# Altium footprint library UWRT_Footprint_Library_2020.PcbLib: 376 footprints (part 15 of 24)
Each footprint in its own frame and in the unit in brackets; x right, y up, seen from the top. Pads: shape width x height; smd on the part's side, far side on the other; paste and mask are expansions set on the pad; w line width, h text height; cw(c..) or ccw(c..) is an arc to the next point about the centre after c.
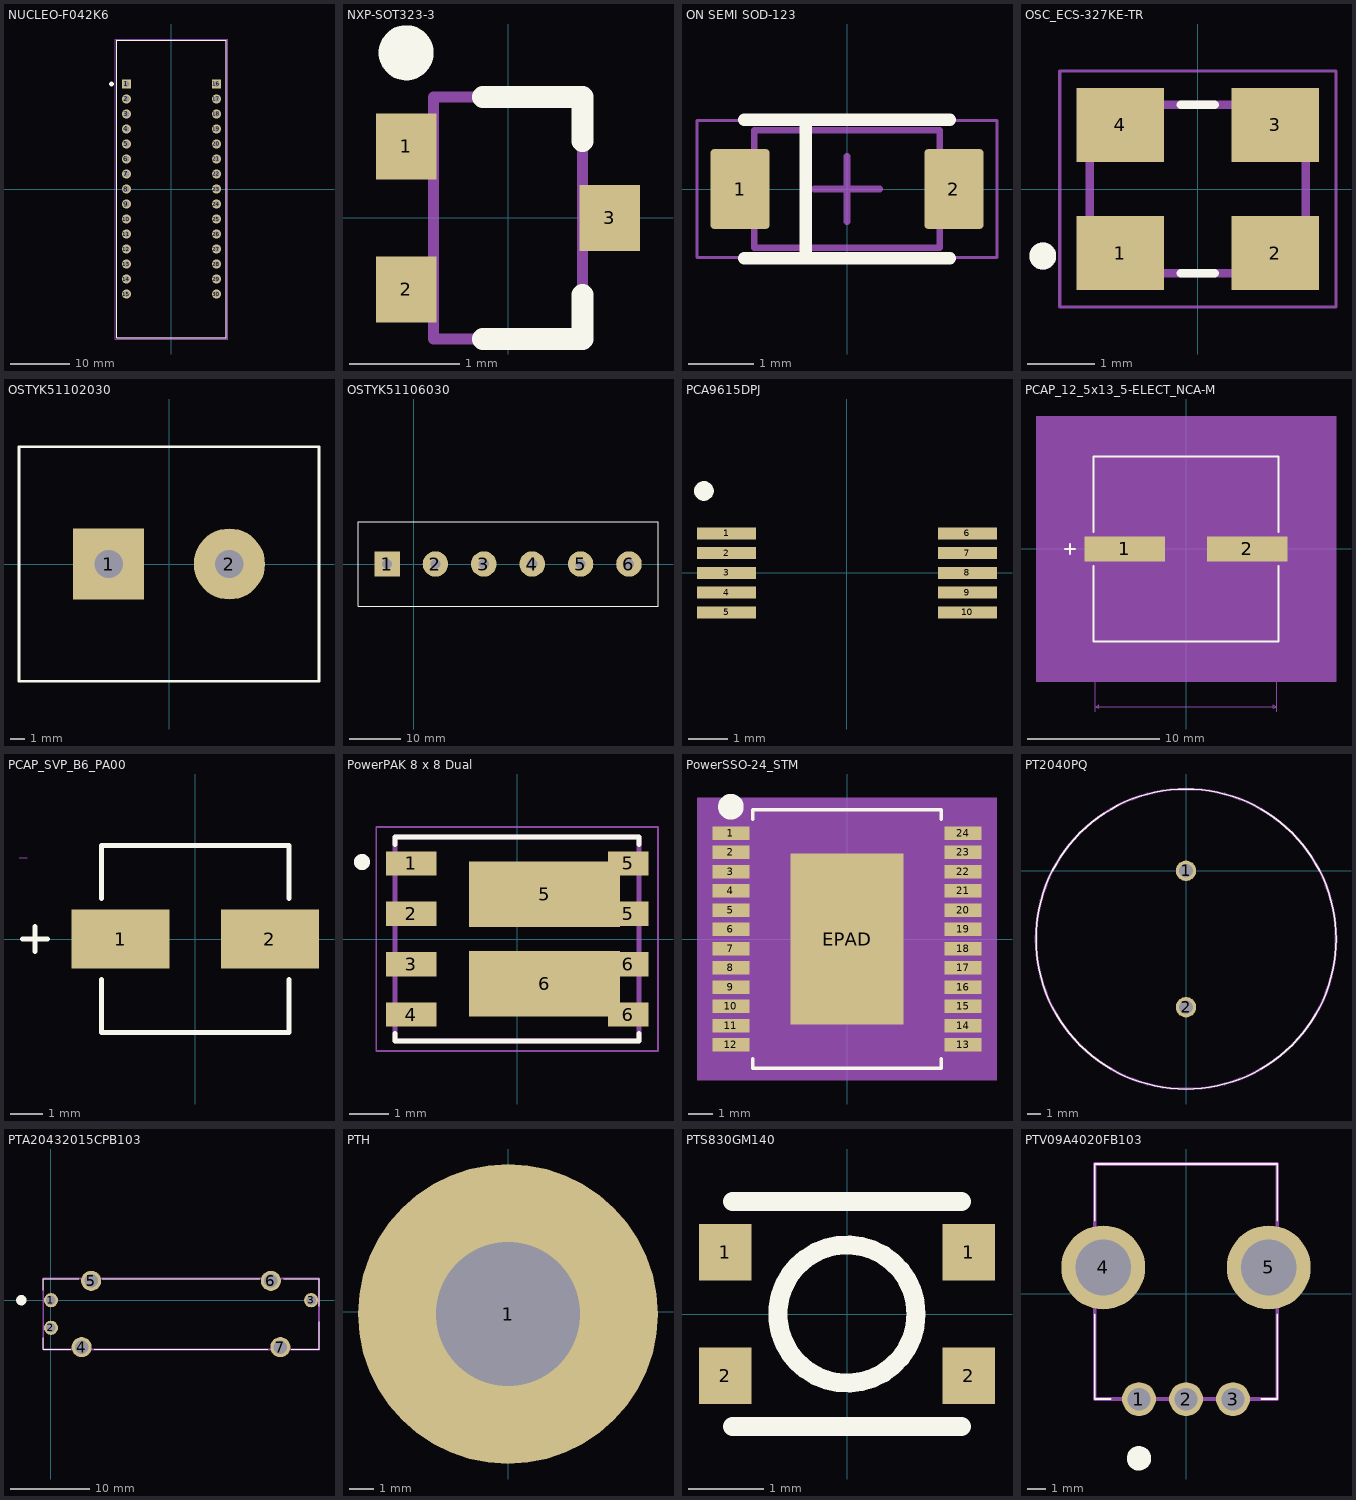
[diagram p14: the footprints below, top view; thin cyan lines are the x and y axes]

## NUCLEO-F042K6 [mm]
pads (30):
  rect 1.53x1.53 hole 1.02: 1(-7.62,17.78) 16(7.62,17.78)
  round 1.53 hole 1.02: 2(-7.62,15.24) 3(-7.62,12.7) 4(-7.62,10.16) 5(-7.62,7.62) 6(-7.62,5.08) 7(-7.62,2.54) 8(-7.62,0) 9(-7.62,-2.54) 10(-7.62,-5.08) 11(-7.62,-7.62) 12(-7.62,-10.16) 13(-7.62,-12.7) 14(-7.62,-15.24) 15(-7.62,-17.78) 17(7.62,15.24) 18(7.62,12.7) 19(7.62,10.16) 20(7.62,7.62) 21(7.62,5.08) 22(7.62,2.54) 23(7.62,0) 24(7.62,-2.54) 25(7.62,-5.08) 26(7.62,-7.62) 27(7.62,-10.16) 28(7.62,-12.7) 29(7.62,-15.24) 30(7.62,-17.78)
Top Overlay:
  circle w0.4: c-10.16,17.78 r0.2
  lines w0.127: -9.27,-25.145 -9.27,25.145 9.27,25.145 9.27,-25.145 -9.27,-25.145
Mechanical 13:
  lines w0.127: -9.27,-25.145 -9.27,25.145 9.27,25.145 9.27,-25.145 -9.27,-25.145
Mechanical 15:
  lines w0.05: -9.52,-25.395 -9.52,25.395 9.52,25.395 9.52,-25.395 -9.52,-25.395

## NXP-SOT323-3 [mm] "SOT23, 3-Leads, Body 2.2x1.35mm, Pitch 0.65mm"
height 1.1
pads (3):
  rect 0.55x0.6 smd paste-1: 1(-0.925,0.65) 2(-0.925,-0.65) 3(0.925,0)
Top Overlay:
  circle w0.25: c-0.925,1.5 r0.125
  lines w0.2: -0.225,-1.1 0.675,-1.1 0.675,-0.7 ; -0.225,1.1 0.675,1.1 0.675,0.7
Top Paste:
  rectangle: -1.2,0.4 -0.65,0.9
  rectangle: -1.2,-0.9 -0.65,-0.4
  rectangle: 0.65,-0.25 1.2,0.25
Mechanical 13:
  lines w0.1: -0.675,-1.1 0.675,-1.1 0.675,1.1 -0.675,1.1 -0.675,-1.1
3D body "SOT65P210X110-3L.step": height 1.1, standoff 0, extent -1.15,-1.1 1.15,1.1

## ON SEMI SOD-123 [mm]
pads (2):
  rrect12% 0.91x1.22 smd: 1(-1.64,0) 2(1.64,0)
Top Overlay:
  lines w0.191: -1.579,-1.059 1.579,-1.059 ; -1.579,1.059 1.579,1.059 ; -0.635,-1.059 -0.635,1.059
Mechanical 1:
  lines w0.1: -1.42,-0.9 -1.42,0.9 1.42,0.9 1.42,-0.9 -1.42,-0.9
Mechanical 15:
  lines w0.05: -2.3,-1.05 -2.3,1.05 2.3,1.05 2.3,-1.05 -2.3,-1.05
  lines w0.1: -0.5,0 0.5,0 ; 0,-0.5 0,0.5
3D body "SODFL371X135-2N.step": height 1.35, standoff 0, extent -1.855,-0.9 1.855,0.9

## OSC_ECS-327KE-TR [mm]
pads (4):
  rect 1.3x1.1 smd: 1(-1.15,-0.95) 2(1.15,-0.95) 3(1.15,0.95) 4(-1.15,0.95)
Top Overlay:
  circle w0.2: c-2.3,-0.994 r0.1
  lines w0.127: -0.25,-1.25 0.25,-1.25 ; -0.25,1.25 0.25,1.25
Mechanical 13:
  circle w0.2: c-2.3,-0.994 r0.1
  lines w0.127: -1.6,-1.25 1.6,-1.25 1.6,1.25 -1.6,1.25 -1.6,-1.25
Mechanical 15:
  lines w0.05: -2.05,-1.75 -2.05,1.75 2.05,1.75 2.05,-1.75 -2.05,-1.75
3D body "ECS-327KE-TR--3DModel-STEP-40055.STEP": height 1, standoff 0, extent -1.6,-1.25 1.6,1.25

## OSTYK51102030 [mm] "Connector; Header; 2 Position"
pads (2):
  rect 5x5 hole 2: 1(-4.25,0)
  round 5 hole 2: 2(4.25,0)
Top Overlay:
  lines w0.2: -10.55,-8.25 10.55,-8.25 10.55,8.25 -10.55,8.25 -10.55,-8.25

## OSTYK51106030 [mm] "Connector; Header; 6 Position"
pads (6):
  rect 5x5 hole 2: 1(-5.25,0)
  round 5 hole 2: 2(4.25,0) 3(13.75,0) 4(23.25,0) 5(32.75,0) 6(42.25,0)
Top Overlay:
  lines w0.2: -10.95,-8.25 47.95,-8.25 47.95,8.25 -10.95,8.25 -10.95,-8.25
3D body "OSTYK51106030.stp": height 18.49, standoff -5.01, extent -10.907,-8.25 48.093,8.25

## PCA9615DPJ [mm] "TSSOP-10"
height 1.1
pads (10):
  rect 1.5x0.3 smd mask+0.05: 1(-3.05,1) 2(-3.05,0.5) 3(-3.05,0) 4(-3.05,-0.5) 5(-3.05,-1) 6(3.05,1) 7(3.05,0.5) 8(3.05,0) 9(3.05,-0.5) 10(3.05,-1)
Top Overlay:
  circle w0.25: c-3.625,2.075 r0.125
3D body "User Library-TSSOP-10 3_1x4_4.STEP": height 1.09, standoff -0.01, extent -3.2,-1.55 3.2,1.55

## PCAP_12_5x13_5-ELECT_NCA-M [mil]
pads (2):
  rect 240.5x75 smd paste+0 mask+0: 1(-183.25,0) 2(183.25,0)
Top Overlay:
  lines w6: -362.5,0 -332.5,0 ; -347.5,-15 -347.5,15 ; -276.5,-50.6 -276.5,-276.5 276.5,-276.5 276.5,-50.6 ; -276.5,50.6 -276.5,276.5 276.5,276.5 276.5,50.6
Mechanical 5:
  region: 448.5,-396.5 -448.5,-396.5 -448.5,396.5 448.5,396.5
Mechanical 7:
  lines w1: -386.5,-271.5 -271.5,-271.5 -271.5,-486.5 ; -386.5,271.5 -271.5,271.5 ; -275.5,-386.5 -275.5,-47.5 ; -275.5,47.5 -275.5,386.5 ; -63,-386.5 -63,-27.5 ; 271.5,-486.5 271.5,-271.5 ; 275.5,47.5 275.5,386.5 ; 313.5,-27.5 418.5,-27.5 ; 313.5,27.5 418.5,27.5 ; 403.5,-77.5 403.5,-27.5 ; 403.5,77.5 403.5,27.5 ; -371.5,-271.5 -366.5,-261.5 -376.5,-261.5 -371.5,-271.5 ; -371.5,-271.5 -371.5,271.5 ; -371.5,271.5 -366.5,261.5 -376.5,261.5 -371.5,271.5 ; -275.5,-371.5 -265.5,-376.5 -265.5,-366.5 -275.5,-371.5 ; -275.5,-371.5 -63,-371.5 ; -275.5,371.5 -265.5,366.5 -265.5,376.5 -275.5,371.5 ; -275.5,371.5 275.5,371.5 ; -271.5,-471.5 -261.5,-476.5 -261.5,-466.5 -271.5,-471.5 ; -271.5,-471.5 271.5,-471.5 ; -63,-371.5 -73,-376.5 -73,-366.5 -63,-371.5 ; 271.5,-471.5 261.5,-476.5 261.5,-466.5 271.5,-471.5 ; 275.5,371.5 265.5,366.5 265.5,376.5 275.5,371.5 ; 403.5,-27.5 408.5,-37.5 398.5,-37.5 403.5,-27.5 ; 403.5,27.5 408.5,37.5 398.5,37.5 403.5,27.5
  text "0.543in/13.792mm" at -100,-516.5 h25
  text "0.197in/5.004mm" at -263,-416.5 h25
  text "0.543in/13.792mm" at -591.5,-12.5 h25
  text "0.551in/13.995mm" at -100,391.5 h25
  text "0.055in/1.397mm" at 423.5,-12.5 h25
  text "Alternate 2 Padstyle: OX90Y60D30P" at -412.5,-637.5 h50
  text "Alternate 1 Padstyle: OX60Y90D30P" at -412.5,-537.5 h50
  text "Default Padstyle: RX240p5Y75D0T" at -387.5,-437.5 h50
Mechanical 13:
  lines w1: -362.5,0 -332.5,0 ; -347.5,-15 -347.5,15 ; -271.5,-135.75 -135.75,-271.5 ; -271.5,135.75 -135.75,271.5 ; -271.5,-271.5 -271.5,271.5 271.5,271.5 271.5,-271.5 -271.5,-271.5
Mechanical 15:
  region: -291.5,-57.5 -323.5,-57.5 -323.5,57.5 -291.5,57.5 -291.5,291.5 291.5,291.5 291.5,57.5 323.5,57.5 323.5,-57.5 291.5,-57.5 291.5,-291.5 -291.5,-291.5
  lines w6: -323.5,-57.5 -291.5,-57.5 -291.5,-291.5 291.5,-291.5 291.5,-57.5 323.5,-57.5 323.5,57.5 291.5,57.5 291.5,291.5 -291.5,291.5 -291.5,57.5 -323.5,57.5 -323.5,-57.5
3D body: height 10, standoff 0, extent 0,0 10,10
3D body "PCAP_12_5x13_5-ELECT_NCA.step": height 573.11, standoff 0, extent -275.5,-266.49 275.52,276.5

## PCAP_SVP_B6_PA00 [mil]
pads (2):
  rect 119.02x72.01 smd paste+0 mask+0: 1(-90.5,0)
  rect 119x72 smd paste+0 mask+0: 2(90.5,0)
Top Overlay:
  lines w6: -209,0 -179,0 ; -194,-15 -194,15 ; -113.5,-49.1 -113.5,-113.5 113.5,-113.5 113.5,-49.1 ; -113.5,49.1 -113.5,113.5 113.5,113.5 113.5,49.1
Mechanical 7:
  lines w1: -213.5,98.5 -203.5,98.5
Mechanical 13:
  lines w1: -209,0 -179,0 ; -194,-15 -194,15
3D body "PCAP_SVP_B6_PAN-M.step": height 238.11, standoff 0, extent -124.01,-110 120,107
3D body: height 10, standoff 0, extent 0,0 10,10

## PowerPAK 8 x 8 Dual [mm]
pads (10):
  rect 1.27x0.61 smd: 1(-2.67,1.905) 2(-2.67,0.635) 3(-2.67,-0.635) 4(-2.67,-1.905)
  rect 3.81x1.65 smd: 5(0.69,1.13) 6(0.69,-1.13)
  rect 1.02x0.61 smd: 5(2.795,0.635) 5(2.795,1.905) 6(2.795,-1.905) 6(2.795,-0.635)
Top Overlay:
  circle w0.2: c-3.91,1.94 r0.1
  lines w0.127: -3.075,-2.38 -3.075,-2.575 3.075,-2.575 3.075,-2.38 ; -3.075,2.38 -3.075,2.575 3.075,2.575 3.075,2.38
Mechanical 13:
  circle w0.2: c-3.91,1.94 r0.1
  lines w0.127: -3.075,-2.575 3.075,-2.575 3.075,2.575 -3.075,2.575 -3.075,-2.575
Mechanical 15:
  lines w0.05: -3.55,-2.825 3.55,-2.825 3.55,2.825 -3.55,2.825 -3.55,-2.825
3D body "SI7540DP-T1-GE3.STEP": height 1.12, standoff 0, extent -3.2,-2.578 2.946,2.578

## PowerSSO-24_STM [mil] "Power Switch/Driver 1:1 N-Channel 13.5A PowerSSO-24"
pads (25):
  rect 61x22 smd paste+0 mask+0: 1(-190,173.23) 2(-190,141.73) 3(-190,110.24) 4(-190,78.74) 5(-190,47.24) 6(-190,15.75) 7(-190,-15.75) 8(-190,-47.24) 9(-190,-78.74) 10(-190,-110.24) 11(-190,-141.73) 12(-190,-173.23) 13(190,-173.23) 14(190,-141.73) 15(190,-110.24) 16(190,-78.74) 17(190,-47.24) 18(190,-15.75) 19(190,15.75) 20(190,47.24) 21(190,78.74) 22(190,110.24) 23(190,141.73) 24(190,173.23)
  rect 185x280 smd paste-139.5 mask+0: EPAD(0,0)
Top Overlay:
  circle w22: c-190,216.5 r10
  lines w6: -154.5,-196.34 -154.5,-211.5 154.5,-211.5 154.5,-196.34 ; -154.5,196.34 -154.5,211.5 154.5,211.5 154.5,196.34
Top Paste:
  region: 88.56,-87.94 34.77,-87.94 34.77,-136.06 88.56,-136.06
  region: 88.56,-31.94 34.77,-31.94 34.77,-80.06 88.56,-80.06
  region: 88.56,24.06 34.77,24.06 34.77,-24.06 88.56,-24.06
  region: 88.56,80.06 34.77,80.06 34.77,31.94 88.56,31.94
  region: 88.56,136.06 34.77,136.06 34.77,87.94 88.56,87.94
  region: 26.9,-87.94 -26.9,-87.94 -26.9,-136.06 26.9,-136.06
  region: 26.9,-31.94 -26.9,-31.94 -26.9,-80.06 26.9,-80.06
  region: 26.9,24.06 -26.9,24.06 -26.9,-24.06 26.9,-24.06
  region: 26.9,80.06 -26.9,80.06 -26.9,31.94 26.9,31.94
  region: 26.9,136.06 -26.9,136.06 -26.9,87.94 26.9,87.94
  region: -34.77,-87.94 -88.56,-87.94 -88.56,-136.06 -34.77,-136.06
  region: -34.77,-31.94 -88.56,-31.94 -88.56,-80.06 -34.77,-80.06
  region: -34.77,24.06 -88.56,24.06 -88.56,-24.06 -34.77,-24.06
  region: -34.77,80.06 -88.56,80.06 -88.56,31.94 -34.77,31.94
  region: -34.77,136.06 -88.56,136.06 -88.56,87.94 -34.77,87.94
Mechanical 5:
  region: 245.5,-231.5 -245.5,-231.5 -245.5,231.5 245.5,231.5
Mechanical 13:
  lines w0: -12,206.5 ccw(c0,206.5) 12,206.5
  lines w1: -206.5,-183.23 -149.5,-183.23 -149.5,-163.23 -206.5,-163.23 -206.5,-183.23 ; -206.5,-151.73 -149.5,-151.73 -149.5,-131.73 -206.5,-131.73 -206.5,-151.73 ; -206.5,-120.24 -149.5,-120.24 -149.5,-100.24 -206.5,-100.24 -206.5,-120.24 ; -206.5,-88.74 -149.5,-88.74 -149.5,-68.74 -206.5,-68.74 -206.5,-88.74 ; -206.5,-57.24 -149.5,-57.24 -149.5,-37.24 -206.5,-37.24 -206.5,-57.24 ; -206.5,-25.75 -149.5,-25.75 -149.5,-5.75 -206.5,-5.75 -206.5,-25.75 ; -206.5,5.75 -149.5,5.75 -149.5,25.75 -206.5,25.75 -206.5,5.75 ; -206.5,37.24 -149.5,37.24 -149.5,57.24 -206.5,57.24 -206.5,37.24 ; -206.5,68.74 -149.5,68.74 -149.5,88.74 -206.5,88.74 -206.5,68.74 ; -206.5,100.24 -149.5,100.24 -149.5,120.24 -206.5,120.24 -206.5,100.24 ; -206.5,131.73 -149.5,131.73 -149.5,151.73 -206.5,151.73 -206.5,131.73 ; -206.5,163.23 -149.5,163.23 -149.5,183.23 -206.5,183.23 -206.5,163.23 ; -149.5,-206.5 -149.5,206.5 149.5,206.5 149.5,-206.5 -149.5,-206.5 ; 149.5,-183.23 206.5,-183.23 206.5,-163.23 149.5,-163.23 149.5,-183.23 ; 149.5,-151.73 206.5,-151.73 206.5,-131.73 149.5,-131.73 149.5,-151.73 ; 149.5,-120.24 206.5,-120.24 206.5,-100.24 149.5,-100.24 149.5,-120.24 ; 149.5,-88.74 206.5,-88.74 206.5,-68.74 149.5,-68.74 149.5,-88.74 ; 149.5,-57.24 206.5,-57.24 206.5,-37.24 149.5,-37.24 149.5,-57.24 ; 149.5,-25.75 206.5,-25.75 206.5,-5.75 149.5,-5.75 149.5,-25.75 ; 149.5,5.75 206.5,5.75 206.5,25.75 149.5,25.75 149.5,5.75 ; 149.5,37.24 206.5,37.24 206.5,57.24 149.5,57.24 149.5,37.24 ; 149.5,68.74 206.5,68.74 206.5,88.74 149.5,88.74 149.5,68.74 ; 149.5,100.24 206.5,100.24 206.5,120.24 149.5,120.24 149.5,100.24 ; 149.5,131.73 206.5,131.73 206.5,151.73 149.5,151.73 149.5,131.73 ; 149.5,163.23 206.5,163.23 206.5,183.23 149.5,183.23 149.5,163.23
  text "*" at -147,153.5 h50
Mechanical 15:
  region: -159.5,-194.23 -230.5,-194.23 -230.5,194.23 -159.5,194.23 -159.5,216.5 159.5,216.5 159.5,194.23 230.5,194.23 230.5,-194.23 159.5,-194.23 159.5,-216.5 -159.5,-216.5
  lines w6: -230.5,-194.23 -159.5,-194.23 -159.5,-216.5 159.5,-216.5 159.5,-194.23 230.5,-194.23 230.5,194.23 159.5,194.23 159.5,216.5 -159.5,216.5 -159.5,194.23 -230.5,194.23 -230.5,-194.23
3D body: height 10, standoff 0, extent 0,0 10,10
3D body "SOIC_160AK-E_STM.step": height 96.1, standoff -2.01, extent -206.69,-206.49 206.7,206.51

## PT2040PQ [mm]
pads (2):
  round 1.5 hole 1: 1(0,0) 2(0,-10)
Top Overlay:
  lines w0.1: 0,-16 cw(c0,-5) 0,6 cw(c0,-5) 0,-16
Mechanical 13:
  lines w0.2: -11,-5 ccw(c0,-5) 11,-5 ccw(c0,-5) -11,-5
3D body "PT-2040PQ.stp": height 9.5, standoff -5, extent -11,-16 11,6

## PTA20432015CPB103 [mm]
pads (7):
  round 1.8 hole 1.2: 1(0,0) 2(0,-3.5) 3(33,0)
  round 2.55 hole 1.7: 4(3.9,-5.95) 5(5.1,2.45) 6(27.9,2.45) 7(29.1,-5.95)
Top Overlay:
  circle w0.7: c-3.75,0 r0.3
  lines w0.1: -1,-4.75 -1,-6.25 2.5,-6.25 ; -1,1.25 -1,2.75 3.5,2.75 ; 5.5,-6.25 27.5,-6.25 ; 6.5,2.75 26.5,2.75 ; 29.5,2.75 34,2.75 34,-0.75 ; 30.5,-6.25 34,-6.25 34,-2.75
Mechanical 13:
  lines w0.2: -1,-6.25 -1,2.75 34,2.75 34,-6.25 -1,-6.25
3D body "PTA2043-2015CPB103.stp": height 6.6, standoff -5, extent -1,-6.699 34,3.199

## PTH [mm] "Plated Through Hole"
pads (1):
  round 12.5 hole 6: 1(0,-0.1)

## PTS830GM140 [mm] "PWR TACTILE SWITCH (RED)"
pads (4):
  rect 0.7x0.75 smd: 1(-1.625,0.825) 1(1.625,0.825) 2(-1.625,-0.825) 2(1.625,-0.825)
Top Overlay:
  circle w0.254: c0,0 r0.922
  lines w0.254: -1.525,-1.5 1.525,-1.5 ; -1.525,1.5 1.525,1.5
3D body "PTS830GM140GSMTRLFS.stp": height 1.35, standoff -0.05, extent -1.75,-1.3 1.75,1.3

## PTV09A4020FB103 [mm]
pads (5):
  round 1.8 hole 1.2: 1(-2.5,-5.6) 2(0,-5.6) 3(2.5,-5.6)
  round 4.46 hole 2.973: 4(-4.4,1.4) 5(4.4,1.4)
Top Overlay:
  circle w0.7: c-2.5,-8.75 r0.3
  lines w0.1: -4.85,-1.1 -4.85,-5.6 -4,-5.6 ; -4.85,3.9 -4.85,6.9 4.85,6.9 4.85,3.9 ; 4,-5.6 4.85,-5.6 4.85,-1.1
Mechanical 13:
  lines w0.2: -4.85,-5.6 -4.85,6.9 4.85,6.9 4.85,-5.6 -4.85,-5.6
3D body "PTV09A-4025U-B103.stp": height 20.09, standoff -5, extent -4.949,-5.805 5.025,6.965